# Altium footprint library Rocket_library.PcbLib: 65 footprints (part 3 of 5)
Each footprint in its own frame and in the unit in brackets; x right, y up, seen from the top. Pads: shape width x height; smd on the part's side, far side on the other; paste and mask are expansions set on the pad; w line width, h text height; cw(c..) or ccw(c..) is an arc to the next point about the centre after c.
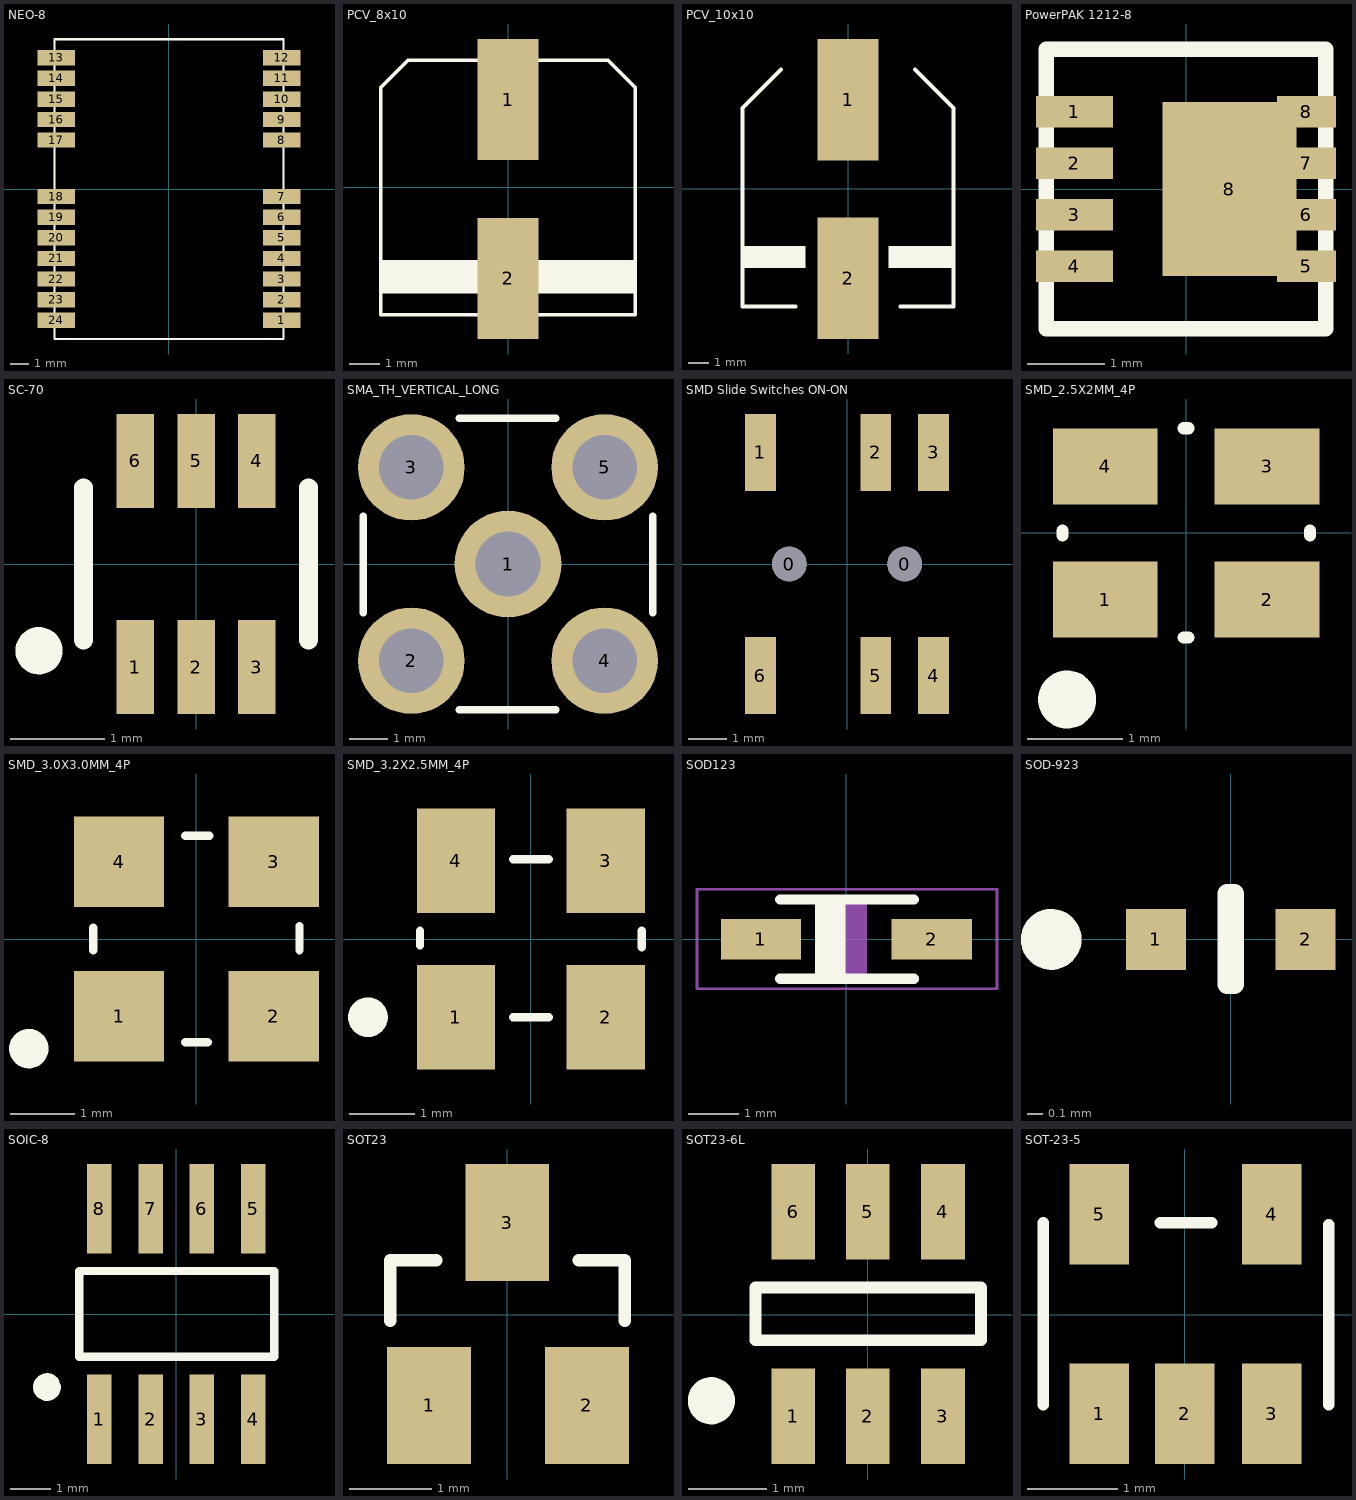
[diagram p2: the footprints below, top view; thin cyan lines are the x and y axes]

## NEO-8 [mm]
pads (24):
  rect 2x0.813 smd: 1(6.02,-7) 2(6.02,-5.9) 3(6.02,-4.8) 4(6.02,-3.7) 5(6.02,-2.6) 6(6.02,-1.5) 7(6.02,-0.4) 8(6.02,2.616) 9(6.02,3.708) 10(6.02,4.801) 11(6.02,5.918) 12(6.02,7.01) 13(-6,7.01) 14(-6,5.918) 15(-6,4.801) 16(-6,3.708) 17(-6,2.616) 18(-6,-0.4) 19(-6,-1.5) 20(-6,-2.6) 21(-6,-3.7) 22(-6,-4.8) 23(-6,-5.9) 24(-6,-7)
Top Overlay:
  lines w0.127: -6.1,-8 -6.1,8.001 6.121,8.001 6.121,-8 -6.1,-8
3D body "User Library-UBLOX_GPS_NEO-6M.STEP": height 2.04, standoff -0.6, extent -6.18,-8.3 6.18,8.3

## PCV_8x10 [mm] "PCV_8x10"
height 10
pads (2):
  rect 2x4 smd: 1(0,2.9) 2(0,-3)
Top Overlay:
  rectangle: -4.2,-3.5 4.2,-2.4
  lines w0.127: -4.2,-4.2 -4.2,3.3 -3.3,4.2 3.3,4.2 4.2,3.3 4.2,-4.2 -4.2,-4.2
3D body "User Library-CL_series_size8x10.STEP": height 10, standoff 0, extent -4.15,-4.45 4.15,4.45

## PCV_10x10 [mm] "PCV_10x10"
height 10
pads (2):
  rect 3x6 smd: 1(0,4.4) 2(0,-4.4)
Top Overlay:
  rectangle: -5.3,-3.9 -2.1,-2.8
  rectangle: 2,-3.9 5.2,-2.8
  lines w0.2: -3.3,5.9 -5.2,4 -5.2,-5.8 -2.6,-5.8 ; 2.6,-5.8 5.2,-5.8 5.2,4 3.3,5.9
3D body "User Library-cap_10x10x10-1.STEP": height 10.3, standoff -0.2, extent -5.25,-5.899 5.25,5.901

## PowerPAK 1212-8 [mm]
height 1
pads (9):
  rect 0.99x0.405 smd: 1(-1.435,0.992) 2(-1.435,0.33) 3(-1.435,-0.33) 4(-1.435,-0.992)
  rect 0.76x0.405 smd: 5(1.55,-0.992) 6(1.55,-0.33) 7(1.55,0.33) 8(1.55,0.992)
  rect 1.725x2.235 smd: 8(0.557,0)
Top Overlay:
  lines w0.2: -1.8,-1.8 -1.8,1.8 1.8,1.8 1.8,-1.8 -1.8,-1.8
3D body "User Library-PowerPAK 1212-8-SiS892DN.STEP": height 1.04, standoff 0, extent -1.65,-1.65 1.65,1.65

## SC-70 [mm]
pads (6):
  rect 0.4x1 smd: 1(-0.65,-1.1) 2(0,-1.1) 3(0.65,-1.1) 4(0.65,1.1) 5(0,1.1) 6(-0.65,1.1)
Top Overlay:
  circle w0.3: c-1.675,-0.925 r0.102
  lines w0.2: -1.2,-0.81 -1.2,0.813 ; 1.2,-0.81 1.2,0.813
3D body "User Library-SC70-6.step": height 0.93, standoff -0.03, extent -1.001,-1.05 1,1.05

## SMA_TH_VERTICAL_LONG [mm]
pads (5):
  round 2.8 hole 1.7: 1(0,0) 2(-2.54,-2.54) 3(-2.54,2.54) 4(2.54,-2.54) 5(2.54,2.54)
Top Overlay:
  lines w0.2: -3.8,-1.275 -3.8,1.25 ; -1.275,-3.825 1.25,-3.825 ; -1.275,3.825 1.25,3.825 ; 3.8,-1.275 3.8,1.25
3D body "132291_3d_model.STEP": height 17.6, standoff -3.92, extent -3.5,-3.5 3.5,3.5

## SMD Slide Switches ON-ON [mm]
pads (8):
  round 0.9 hole 0.9 unplated paste+0 mask+0.102: 0(-1.5,0) 0(1.5,0)
  rect 0.8x2 smd: 1(-2.25,2.9) 2(0.75,2.9) 3(2.25,2.9) 4(2.25,-2.9) 5(0.75,-2.9) 6(-2.25,-2.9)
3D body "SSSS820101.STEP": height 2.9, standoff -0.5, extent -3.35,-2.95 3.35,2.95

## SMD_2.5X2MM_4P [mm]
height 1
pads (4):
  rect 1.1x0.8 smd: 1(-0.85,-0.7) 2(0.85,-0.7) 3(0.85,0.7) 4(-0.85,0.7)
Top Overlay:
  circle w0.305: c-1.25,-1.75 r0.152
  lines w0.127: -1.3,-0.025 -1.3,0.025 ; -0.025,-1.1 0.025,-1.1 ; -0.025,1.1 0.025,1.1 ; 1.3,-0.025 1.3,0.025
3D body "SM2520-4.step": height 0.8, standoff -0.03, extent -1.25,-1.004 1.25,0.996

## SMD_3.0X3.0MM_4P [mm]
height 0.9
pads (4):
  rect 1.4x1.4 smd: 1(-1.2,-1.2) 2(1.2,-1.2) 3(1.2,1.2) 4(-1.2,1.2)
Top Overlay:
  circle w0.305: c-2.6,-1.7 r0.152
  lines w0.127: -1.6,-0.175 -1.6,0.175 ; -0.175,-1.6 0.175,-1.6 ; -0.175,1.6 0.2,1.6 ; 1.6,-0.175 1.6,0.2
3D body: height 0.9, standoff 0, extent -1.5,-1.509 1.5,1.5

## SMD_3.2X2.5MM_4P [mm]
pads (4):
  rect 1.2x1.6 smd: 1(-1.15,-1.2) 2(1.15,-1.2) 3(1.15,1.2) 4(-1.15,1.2)
Top Overlay:
  circle w0.305: c-2.5,-1.2 r0.152
  lines w0.127: -1.7,-0.1 -1.7,0.125 ; -0.275,-1.2 0.275,-1.2 ; -0.275,1.225 0.275,1.225 ; 1.7,-0.125 1.7,0.125
3D body: height 0.9, standoff 0, extent -1.699,-1.199 1.701,1.219

## SOD123 [mil]
pads (2):
  rect 63x32 smd: 1(-66.93,0) 2(67,0)
Top Overlay:
  lines w7.87: -52.01,-30.98 53,-30.98 ; -52.01,31 53,31 ; -20.51,-30.98 -20.51,31 ; -16.57,-30.98 -16.57,31 ; -12.64,-30.98 -12.64,31 ; -8.7,-30.98 -8.7,31 ; -4.76,-30.98 -4.76,31
Mechanical 6:
  rectangle: -15.75,-27.56 16,28
Mechanical 37:
  lines w2: -117.05,-38.7 -117.05,39 118,39 118,-38.7 -117.05,-38.7
3D body "User Library-SOD123.STEP": height 50, standoff 0, extent -72.84,-31.5 72.83,31.49

## SOD-923 [mm]
pads (2):
  rect 0.4x0.406 smd: 1(-0.5,0) 2(0.5,0)
Top Overlay:
  circle w0.203: c-1.2,0 r0.102
  lines w0.127: -0.025,-0.3 -0.025,0.305 0.025,0.305 0.025,-0.3 -0.025,-0.3
3D body "User Library-DIODE_SOD-923.STEP": height 0.43, standoff 0, extent -0.525,-0.325 0.525,0.325

## SOIC-8 [mil]
pads (8):
  rect 24x87 smd: 1(-75,-102.36) 2(-25,-102.36) 3(25,-102.36) 4(75,-102.36) 5(75,103) 6(25,103) 7(-25,103) 8(-75,103)
Top Overlay:
  lines w8: 95,-41.34 -94.49,-41.34 -94.49,42.32 95.47,42.32 95.47,-41.34
  lines w13.78: -120.83,-66.74 ccw(c-125.98,-70.87) -119.38,-70.87
3D body "User Library-SOIC8_JEDEC_MS-012AA.STEP": height 68.7, standoff -0.31, extent -97.44,-122.03 99.41,122.04

## SOT23 [mil]
pads (3):
  rect 40x56 smd: 1(-37.4,-43.31) 2(38,-43.31) 3(0,44)
Top Overlay:
  lines w6: -56,-2.95 -56,26 -34,26 ; 34,26 56,26 56,-2.95
3D body "User Library-SOT95P280X135-3M[SOT23_TO-236AA].STEP": height 51.18, standoff 0, extent -59.05,-59.05 59.06,59.06

## SOT23-6L [mil]
pads (6):
  rect 22x48 smd: 1(-37.4,-51.18) 2(0,-51.18) 3(38,-51.18) 4(38,52) 5(0,52) 6(-37.4,52)
Top Overlay:
  circle w15.75: c-78.74,-43.31 r4
  lines w6: -56.51,-12.8 -56.51,13.78 57.09,13.78 57.09,-12.8 -56.51,-12.8
3D body "User Library-SOT23-6.STEP": height 51.18, standoff 0, extent -59.06,-59.05 59.05,59.06

## SOT-23-5 [mil]
pads (5):
  rect 26x44 smd: 1(-37.4,-43.31) 2(0,-43.31) 3(38,-43.31) 4(38,44) 5(-37.4,44)
Top Overlay:
  lines w5: -62.01,-39.37 -62.01,40.35 ; -10.83,40.35 11.81,40.35 ; 62.99,-39.37 62.99,39.37
3D body "SW3DPS-SOT-23-5-DEFAULT.STEP": height 43.81, standoff 0.5, extent -59.05,-49.21 59.06,49.21